# Altium footprint library Module.PcbLib: 57 footprints (part 4 of 4)
Each footprint in its own frame and in the unit in brackets; x right, y up, seen from the top. Pads: shape width x height; smd on the part's side, far side on the other; paste and mask are expansions set on the pad; w line width, h text height; cw(c..) or ccw(c..) is an arc to the next point about the centre after c.
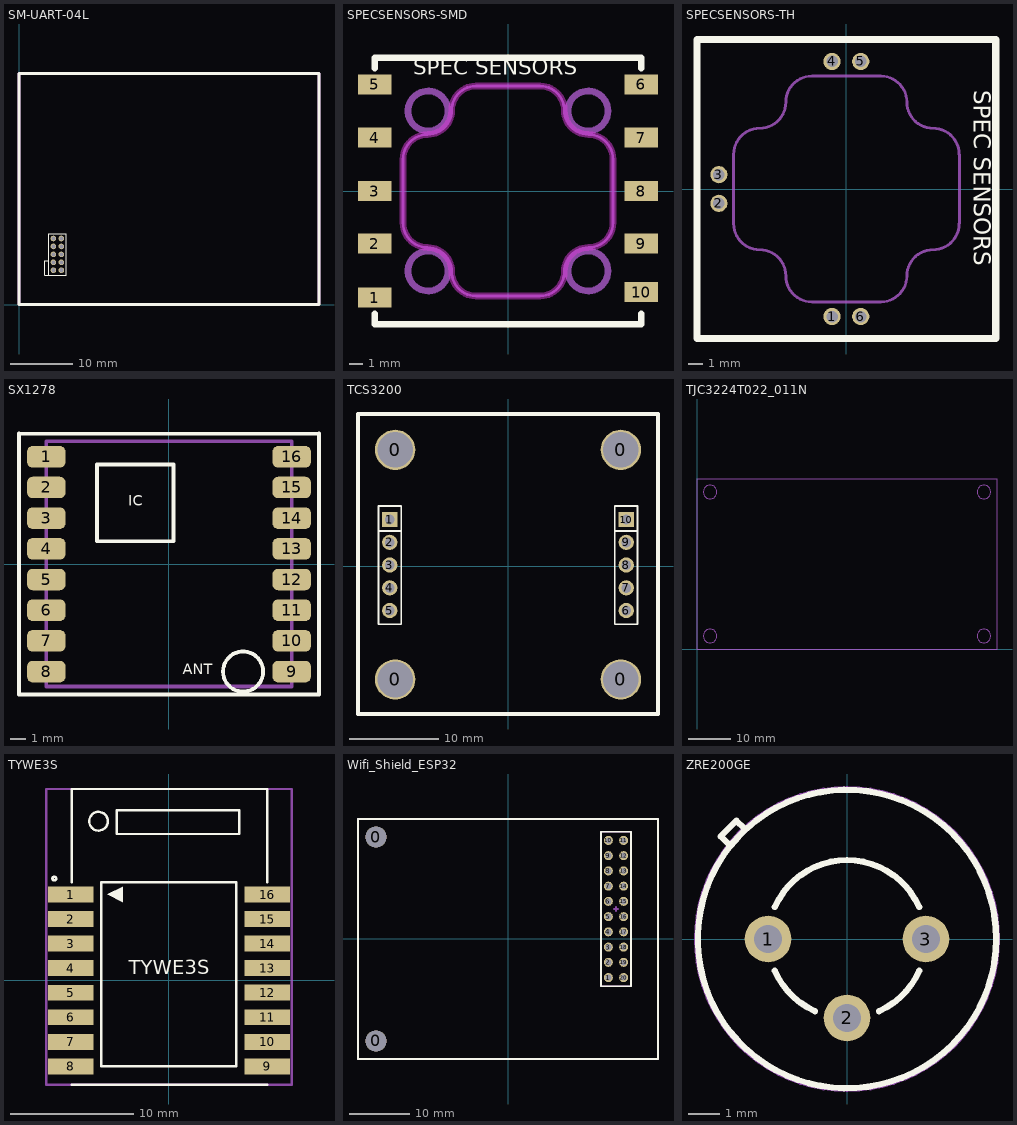
[diagram p3: the footprints below, top view; thin cyan lines are the x and y axes]

## SM-UART-04L [mm]
pads (10):
  round 0.9 hole 0.65: 1(5.5,5.5) 2(6.77,5.5) 3(5.5,6.77) 4(6.77,6.77) 5(5.5,8.04) 6(6.77,8.04) 7(5.5,9.31) 8(6.77,9.31) 9(5.5,10.58) 10(6.77,10.58)
Top Overlay:
  lines w0.2: 4.735,7.04 4.135,7.04 4.135,4.74 4.735,4.74 ; 4.735,4.74 4.735,11.3 7.535,11.3 7.535,4.74 4.735,4.74
  lines w0.5: 0,0 48,0 48,37 0,37 0,0
Mechanical 13:
  lines w0.5: 0,0 0,37 48,37 48,0 0,0
  text ".Designator" at 3.47,5.91 h4
Mechanical 15:
  lines w0.5: 0,0 0,37 48,37 48,0 0,0
  text ".Comment" at 3.57,6.01 h4
3D body "PM2.5.stp": height 12, standoff 0, extent 0,0 48,37

## SPECSENSORS-SMD [mm]
pads (10):
  rect 2.5x1.5 smd: 1(-10,-8) 2(-10,-3.945) 3(-10,0) 4(-10,4) 5(-10,8) 6(10,8) 7(10,4) 8(10,0) 9(10,-3.945) 10(10,-7.585)
Top Overlay:
  lines w0.5: -10,-9.2 -10,-10 10,-10 10,-9.2 ; -10,9.2 -10,10 10,10 10,9.2
  text "SPEC SENSORS" at -7.1,8.3 h2
Keep-Out Layer:
  lines w0.5: -7.875,-2.415 -7.875,2.415 ; -7.86,-2.415 ccw(c-6.04,-2.415) -6.04,-4.235 cw(c-6.04,-6.055) -4.22,-6.055 ccw(c-2.4,-6.055) -2.4,-7.875 2.4,-7.875 ccw(c2.4,-6.055) 4.22,-6.055 cw(c6.04,-6.055) 6.04,-4.235 ccw(c6.04,-2.415) 7.86,-2.415 ; -7.86,2.415 cw(c-6.04,2.415) -6.04,4.235 ccw(c-6.04,6.055) -4.22,6.055 cw(c-2.4,6.055) -2.4,7.875 2.4,7.875 cw(c2.4,6.055) 4.22,6.055 ccw(c6.04,6.055) 6.04,4.235 cw(c6.04,2.415) 7.86,2.415 ; 7.875,-2.415 7.875,2.415
Mechanical 1:
  circle w0.5: c-6,6 r1.5
  circle w0.5: c-6,-6 r1.5
  circle w0.5: c6,-6 r1.5
  circle w0.5: c6,6 r1.5
  lines w0.2: -7.875,-2.415 -7.875,2.415 ; -7.86,-2.415 ccw(c-6.04,-2.415) -6.04,-4.235 cw(c-6.04,-6.055) -4.22,-6.055 ccw(c-2.4,-6.055) -2.4,-7.875 2.4,-7.875 ccw(c2.4,-6.055) 4.22,-6.055 cw(c6.04,-6.055) 6.04,-4.235 ccw(c6.04,-2.415) 7.86,-2.415 ; -7.86,2.415 cw(c-6.04,2.415) -6.04,4.235 ccw(c-6.04,6.055) -4.22,6.055 cw(c-2.4,6.055) -2.4,7.875 2.4,7.875 cw(c2.4,6.055) 4.22,6.055 ccw(c6.04,6.055) 6.04,4.235 cw(c6.04,2.415) 7.86,2.415 ; 7.875,-2.415 7.875,2.415
3D body: height 3.05, standoff 0, extent -10,-9.9 10,9.9

## SPECSENSORS-TH [mm]
pads (6):
  round 1.2 hole 0.8: 1(-1,-8.89) 2(-8.89,-1) 3(-8.89,1) 4(-1,8.89) 5(1,8.89) 6(1,-8.89)
Top Overlay:
  lines w0.5: -10.414,-10.414 -10.414,10.414 10.414,10.414 10.414,-10.414 -10.414,-10.414
  text "SPEC SENSORS" at 8.5,6.9 h2
Mechanical 1:
  lines w0.2: -7.875,-2.415 -7.875,2.415 ; -7.86,-2.415 ccw(c-6.04,-2.415) -6.04,-4.235 cw(c-6.04,-6.055) -4.22,-6.055 ccw(c-2.4,-6.055) -2.4,-7.875 2.4,-7.875 ccw(c2.4,-6.055) 4.22,-6.055 cw(c6.04,-6.055) 6.04,-4.235 ccw(c6.04,-2.415) 7.86,-2.415 ; -7.86,2.415 cw(c-6.04,2.415) -6.04,4.235 ccw(c-6.04,6.055) -4.22,6.055 cw(c-2.4,6.055) -2.4,7.875 2.4,7.875 cw(c2.4,6.055) 4.22,6.055 ccw(c6.04,6.055) 6.04,4.235 cw(c6.04,2.415) 7.86,2.415 ; 7.875,-2.415 7.875,2.415
3D body: height 4.19, standoff 0, extent -10.4,-10.4 10.4,10.4

## SX1278 [mm]
pads (16):
  rrect50% 2.5x1.4 smd: 1(-8,7) 2(-8,5) 3(-8,3) 4(-8,1) 5(-8,-1) 6(-8,-3) 7(-8,-5) 8(-8,-7) 9(8,-7) 10(8,-5) 11(8,-3) 12(8,-1) 13(8,1) 14(8,3) 15(8,5) 16(8,7)
Top Overlay:
  circle w0.254: c4.827,-7 r1.308
  lines w0.254: 9.778,-8.501 -9.778,-8.494 -9.778,8.524 9.778,8.498 ; 9.778,-8.494 9.778,8.524 ; -4.698,1.492 -4.698,6.492 0.302,6.492 0.302,1.492 -4.698,1.492
  text "ANT" at 0.89,-7.398 h1.2
  text "IC" at -2.67,3.594 h1.2
Mechanical 13:
  lines w0.254: -8,-7.986 8,-7.986 8,8.016 -8,8.016 -8,-7.986
Mechanical 15:
  lines w0.254: -8,-7.986 -8,8.016 8,8.016 8,-7.986 -8,-7.986

## TCS3200 [mm]
pads (14):
  round 4.5 hole 4: 0(-12.6,-12.637) 0(-12.6,13) 0(12.6,-12.637) 0(12.6,13)
  rect 1.7x1.7 hole 1.1: 1(-13.2,5.207) 10(13.2,5.207)
  round 1.7 hole 1.1: 2(-13.2,2.667) 3(-13.2,0.127) 4(-13.2,-2.413) 5(-13.2,-4.953) 6(13.2,-4.953) 7(13.2,-2.413) 8(13.2,0.127) 9(13.2,2.667)
Top Overlay:
  lines w0.2: -14.47,3.937 -11.93,3.937 ; 11.93,3.937 14.47,3.937 ; -14.47,-6.473 -11.93,-6.473 -11.93,6.727 -14.47,6.727 -14.47,-6.473 ; 11.93,-6.473 11.93,6.727 14.47,6.727 14.47,-6.473 11.93,-6.473
  lines w0.5: -16.75,-16.5 16.75,-16.5 16.75,17 -16.75,17 -16.75,-16.5
3D body "Color_sensor.stp": height 27.55, standoff 1.79, extent -16.75,-16.5 16.75,17
3D body "61300511821.stp": height 8.51, standoff -3.09, extent 11.95,-6.473 14.45,6.727
3D body "61300511821.stp": height 8.51, standoff -3.09, extent -14.45,-6.473 -11.95,6.727

## TJC3224T022_011N [mm]
Mechanical 1:
  circle w0.2: c67.42,36.92 r1.6
  circle w0.2: c67.42,3.08 r1.6
  circle w0.2: c3.08,36.92 r1.6
  circle w0.2: c3.08,3.08 r1.6
  lines w0.2: 0,0 70.5,0 70.5,40 0,40 0,0
3D body "TJC3224T022_011N.step": height 13.2, standoff 8.31, extent 0,0 70.5,40

## TYWE3S [mm]
pads (16):
  rect 3.7x1.3 smd: 1(-8,6.998) 2(-8,4.998) 3(-8,2.998) 4(-8,1.003) 5(-8,-1.003) 6(-8,-3.002) 7(-8,-5.002) 8(-8,-6.998) 9(8,-6.998) 10(8,-5.002) 11(8,-3.002) 12(8,-1.002) 13(8,1.003) 14(8,2.998) 15(8,4.998) 16(8,6.998)
Top Overlay:
  circle w0.2: c-9.347,8.295 r0.15
  circle w0.2: c-5.741,12.973 r0.762
  region: -5.043,7.01 -3.773,6.375 -3.773,7.645
  lines w0.2: -7.938,-8.504 8,-8.502 ; -7.938,7.998 -7.938,15.598 8,15.598 8,7.998 ; -5.513,-6.998 5.485,-6.998 5.485,7.988 -5.513,7.988 -5.513,-6.998 ; -4.268,11.931 5.739,11.931 5.739,13.862 -4.268,13.862 -4.268,11.931
  text "TYWE3S" at -3.265,0.102 h2
Mechanical 2:
Mechanical 4:
  text ">VALUE" at 8.483,6.998 h0.04
  text ">VALUE" at 8.483,4.991 h0.04
  text ">VALUE" at 8.483,3.01 h0.04
  text ">VALUE" at 8.483,1.003 h0.04
  text ">VALUE" at 8.483,-1.003 h0.04
  text ">VALUE" at 8.483,-3.01 h0.04
  text ">VALUE" at 8.483,-4.991 h0.04
  text ">VALUE" at 8.483,-6.998 h0.04
  text ">VALUE" at -8.51,-4.991 h0.04
  text ">VALUE" at -8.51,-3.01 h0.04
  text ">VALUE" at -8.51,-1.003 h0.04
  text ">VALUE" at -8.51,1.003 h0.04
  text ">VALUE" at -8.51,3.01 h0.04
  text ">VALUE" at -8.51,4.991 h0.04
  text ">VALUE" at -8.51,6.998 h0.04
  text ">VALUE" at -8.459,6.972 h0.04
  text ">VALUE" at -8.459,4.94 h0.04
  text ">VALUE" at -8.485,-4.991 h0.04
Mechanical 13:
  lines w0.2: -10,-8.502 10,-8.502 10,15.598 -10,15.598 -10,-8.502
  text ".Designator" at -7,6.998 h2
Mechanical 15:
  lines w0.2: -10,-8.502 -10,15.598 10,15.598 10,-8.502 -10,-8.502
  text ".Comment" at -7,6.998 h2
3D body "AI-THINKER_ESP-12.STEP": height 2.8, standoff 0, extent -7.964,-8.469 8.036,15.531

## Wifi_Shield_ESP32 [mm]
pads (22):
  round 3.5 hole 3.5: 0(-22,-17) 0(-22,17)
  round 1.5 hole 1: 1(16.73,-6.43) 2(16.73,-3.89) 3(16.73,-1.35) 4(16.73,1.19) 5(16.73,3.73) 6(16.73,6.27) 7(16.73,8.81) 8(16.73,11.35) 9(16.73,13.89) 10(16.73,16.43) 11(19.27,16.43) 12(19.27,13.89) 13(19.27,11.35) 14(19.27,8.81) 15(19.27,6.27) 16(19.27,3.73) 17(19.27,1.19) 18(19.27,-1.35) 19(19.27,-3.89) 20(19.27,-6.43)
Top Overlay:
  lines w0.254: -25,-20 -25,20 25,20 25,-20 -25,-20 ; 15.5,-7.905 20.5,-7.905 20.5,17.905 15.5,17.905 15.5,-7.905
Mechanical 13:
  lines w0.254: -25,-20 -25,20 25,20 25,-20 -25,-20 ; 15.5,-7.905 15.5,17.905 20.5,17.905 20.5,-7.905 15.5,-7.905
Mechanical 15:
  lines w0.254: 17.625,5 18.375,5 ; 18,4.625 18,5.375 ; -25,-20 -25,20 25,20 25,-20 -25,-20 ; 15.5,-7.905 20.5,-7.905 20.5,17.905 15.5,17.905 15.5,-7.905
3D body "3D_PCB1_2024-01-05.step": height 7.11, standoff -3.19, extent 15.5,-7.905 20.5,17.905
3D body "Wifi_Shield_ESP32.step": height 18, standoff 0.52, extent -25,-20 25,20

## ZRE200GE [mm]
pads (3):
  round 1.5 hole 0.9: 1(-2.54,0) 2(0,-2.54) 3(2.54,0)
Top Overlay:
  circle w0.2: c0,0 r4.8
  lines w0.2: -3.81,3.048 -4.064,3.302 -3.556,3.81 -3.302,3.556 ; -2.327,-1.019 ccw(c0,0) -1.032,-2.321 ; -2.321,1.032 cw(c0,0) 2.321,1.032 ; 1.032,-2.321 ccw(c0,0) 2.327,-1.019
Mechanical 13:
  circle w0.2: c0,0 r4.826
  text ".Designator" at -3.556,-0.508 h2
Mechanical 15:
  circle w0.2: c0,0 r4.826
  text ".Comment" at -3.556,-0.508 h2
3D body "User Library-PIR_S_Orginal.step": height 4.7, standoff -2, extent -4.55,-4.55 4.55,4.55